# Altium footprint library Library.PcbLib: 144 footprints (part 1 of 9)
Each footprint in its own frame and in the unit in brackets; x right, y up, seen from the top. Pads: shape width x height; smd on the part's side, far side on the other; paste and mask are expansions set on the pad; w line width, h text height; cw(c..) or ccw(c..) is an arc to the next point about the centre after c.
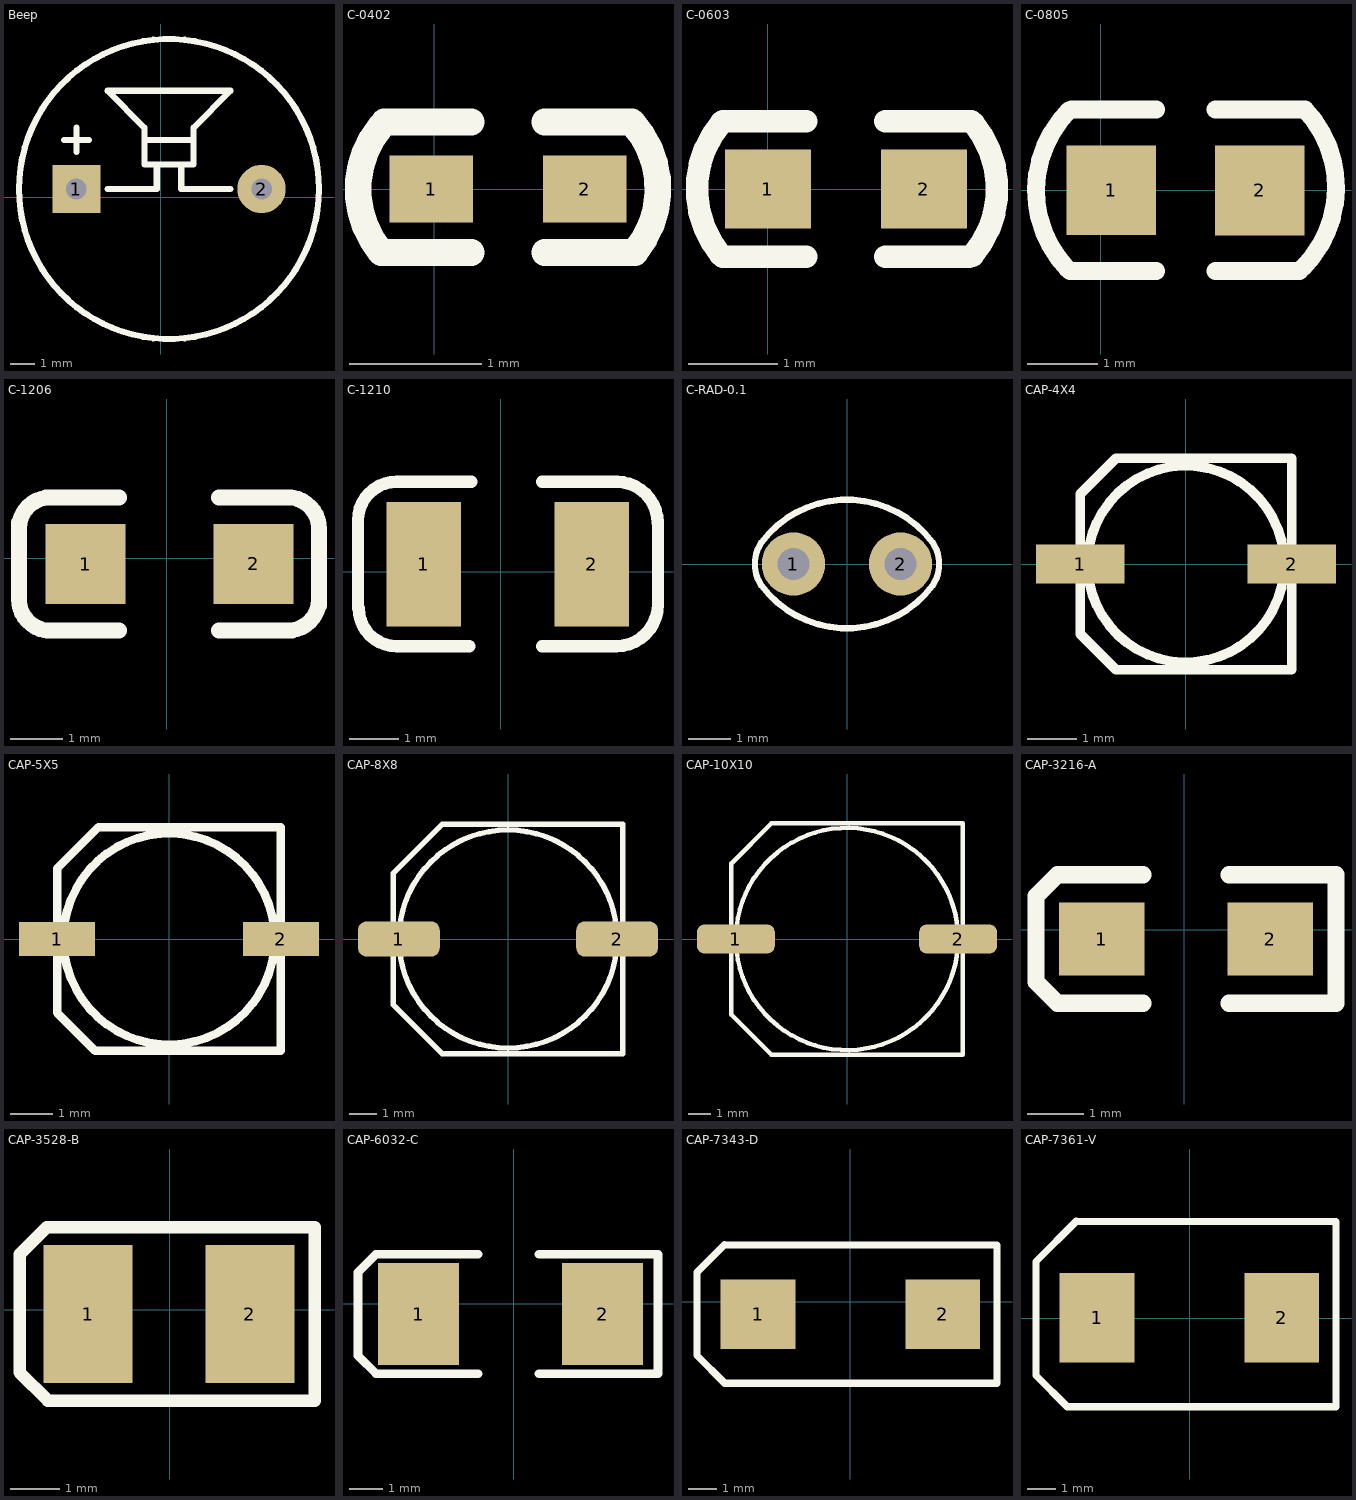
[diagram p0: the footprints below, top view; thin cyan lines are the x and y axes]

## Beep [mm] "蜂鸣器"
height 6
pads (2):
  rect 2x2 hole 0.85: 1(-3.479,0.332)
  round 2 hole 0.85: 2(4.171,0.332)
Top Overlay:
  circle w0.254: c0.346,0.332 r6.2
  lines w0.254: -3.987,2.364 -2.971,2.364 ; -3.479,1.856 -3.479,2.872 ; -2.194,0.332 -0.162,0.332 -0.162,1.348 ; -0.67,2.364 1.362,2.364 ; 0.854,1.348 0.854,0.332 2.886,0.332 ; -2.194,4.396 -0.67,2.872 -0.67,1.348 1.362,1.348 1.362,2.872 2.886,4.396 -2.194,4.396
3D body "SW3dPS-WST-1203UX.STEP": height 9.65, standoff -4.5, extent -9.108,-5.668 6.346,6.332

## C-0402 [mil]
pads (2):
  rect 25x20 smd: 1(-1,0) 2(45,0)
Top Overlay:
  lines w8: -15.94,-19 11,-19 ; -15.94,-18.95 cw(c6.42,-0.05) -15.95,18.84 ; -15,20 11,20 ; 33,-19 59.95,-19 ; 33,20 59,20 cw(c37.58,0.05) 59.95,-18.84
3D body "cap_0402.STEP": height 19.68, standoff 0, extent 2.31,-10 41.69,9.69

## C-0603 [mil]
pads (2):
  rect 38x35 smd: 1(0,0) 2(69,0)
Top Overlay:
  lines w10: -21,-29 cw(c14.45,-0.04) -20.48,29.56 ; -20,-30 17,-30 ; -20,30 17,30 ; 52,-30 89,-30 ; 52,30 90,30 ; 90.48,-29.56 ccw(c55.55,0.04) 91,29
3D body "User Library-0603 SMD Capacitor.STEP": height 11.89, standoff 0, extent 3.8,-15.8 66.8,15.7

## C-0805 [mil]
pads (2):
  rect 50x50 smd: 1(6,0) 2(88.7,-0.1)
Top Overlay:
  lines w10: -18.66,-43.67 cw(c27.24,-0.08) -17.7,44.5 ; -17.2,-45 31,-45 ; -16.3,45 31,45 ; 64,-45 111,-45 ; 64,45 113.1,45 ; 112.92,-43.04 ccw(c67.98,1.54) 114,45
3D body "User Library-0805 SMD Capacitor.STEP": height 30.39, standoff -0.39, extent 7.93,-24.5 86.67,24.71

## C-1206 [mil]
pads (2):
  rect 60x60 smd: 1(-60.91,-4.35) 2(65.09,-4.35)
Top Overlay:
  lines w11.81: -110.91,-30.35 ccw(c-87.41,-30.85) -87.91,-54.35 ; -110.91,22.65 cw(c-87.41,22.15) -86.91,45.65 ; 90.09,-54.35 ccw(c90.59,-30.85) 114.09,-31.35 ; 91.09,45.65 cw(c90.59,22.15) 114.09,21.65
  lines w12: -110.91,-31.35 -110.91,26.65 ; -89.91,-54.35 -35.91,-54.35 ; -88.91,45.65 -35.91,45.65 ; 39.09,-54.35 92.09,-54.35 ; 39.09,45.65 93.09,45.65 ; 114.09,-35.35 114.09,22.65
3D body "Capacitor 1206 SMD1.step": height 39.45, standoff 0, extent -60.89,-35.85 65.09,27.15

## C-1210 [mil]
pads (2):
  rect 60x100 smd: 1(-62,6) 2(73,6)
Top Overlay:
  lines w10: -114.8,-29.36 -114.8,41.08 cw(c-83.75,41.08) -83.75,72.13 ; -114.27,-29.36 ccw(c-83.63,-29.36) -83.63,-60 -25.3,-60 ; -83.75,72 -24,72 ; 33,-60 92.52,-60 ccw(c92.52,-26.32) 126.2,-26.32 126.2,39.82 ; 33,72 93.32,72 ; 93,72 cw(c93,39.12) 125.88,39.12
3D body "1210(3225M) Cap.STEP": height 67.1, standoff 0, extent -72.75,-44 84.75,54

## C-RAD-0.1 [mm]
pads (2):
  round 1.5 hole 0.762: 1(-1.27,0) 2(1.27,0)
Top Overlay:
  lines w0.15: -2.032,-0.508 ccw(c0,1.016) 2.032,-0.508 ; -2.032,0.508 cw(c0,-1.016) 2.032,0.508 ; -2.031,-0.507 cw(c-1.27,0) -2.031,0.507 ; 2.031,-0.507 ccw(c1.27,0) 2.031,0.507
3D body "Cap_100n.step": height 5.92, standoff -2, extent -2.919,-0.848 2.919,0.848

## CAP-4X4 [mm]
height 5.5
pads (2):
  rect 1.8x0.8 smd: 1(-2.15,0) 2(2.15,0)
Top Overlay:
  circle w0.2: c0,0 r2
  lines w0.2: -1.433,-2.139 -2.15,-1.422 ; -1.433,2.139 -2.15,1.422 ; -2.15,-1.422 -1.422,-2.15 2.15,-2.15 2.15,2.15 -1.422,2.15 -2.15,1.422 ; -2.15,-1.422 -2.15,1.422
3D body "SL-B.step": height 5.2, standoff 0, extent -2.286,-2.159 2.314,2.141

## CAP-5X5 [mm]
height 5.5
pads (2):
  rect 1.8x0.8 smd: 1(-2.65,0) 2(2.65,0)
Top Overlay:
  circle w0.2: c0,0 r2.5
  lines w0.2: -2.65,-1.744 -1.744,-2.65 2.65,-2.65 2.65,2.65 -1.668,2.65 -2.65,1.668 -2.65,-1.744
3D body "SL-D.step": height 5.2, standoff 0, extent -2.8,-2.667 2.8,2.633

## CAP-8X8 [mm]
height 10
pads (2):
  rrect50% 3x1.3 smd: 1(-4,0) 2(4,0)
Top Overlay:
  circle w0.2: c0,0 r4
  lines w0.2: -4.2,-2.413 -4.2,2.413 -2.413,4.2 4.2,4.2 4.2,-4.2 -2.413,-4.2 -4.2,-2.413
3D body "SL-H.step": height 10.5, standoff 0, extent -4.521,-4.216 4.479,4.084

## CAP-10X10 [mm]
height 10
pads (2):
  rrect50% 3.5x1.3 smd: 1(-5,0) 2(5,0)
Top Overlay:
  circle w0.2: c0,0 r5
  lines w0.2: -5.2,3.404 -5.2,-3.404 -3.404,-5.2 5.2,-5.2 5.2,5.2 -3.404,5.2 -5.191,3.413
3D body "SW3dPS-capacitor size G.STEP": height 10.21, standoff -0.01, extent -5.775,-5.118 5.825,5.182

## CAP-3216-A [mm] "钽电容"
height 2
pads (2):
  rect 1.524x1.3 smd: 1(-1.464,-0.162) 2(1.533,-0.162)
Top Overlay:
  lines w0.305: -0.727,-1.305 -2.251,-1.305 -2.632,-0.924 -2.632,0.6 -2.251,0.981 -0.727,0.981 ; 0.797,-1.305 2.702,-1.305 2.702,0.981 0.797,0.981
3D body "TAJ-A.STEP": height 1.6, standoff 0, extent -1.565,-0.95 1.635,0.65

## CAP-3528-B [mm] "钽电容"
height 3
pads (2):
  rect 1.8x2.794 smd: 1(-1.653,-0.088) 2(1.623,-0.088)
Top Overlay:
  lines w0.254: -3.038,-1.269 -2.466,-1.84 2.931,-1.84 2.931,1.665 -2.492,1.665 -3.038,1.119 -3.038,-1.269
3D body "TAJ-B.STEP": height 1.9, standoff 0, extent -1.765,-1.488 1.735,1.312

## CAP-6032-C [mil] "钽电容"
pads (2):
  rect 95x120 smd: 1(-111.97,-12.03) 2(104.03,-12.03)
Top Overlay:
  lines w10: -41.97,-82.03 -155.97,-82.03 -161.97,-82.03 -182.97,-61.03 -182.97,36.97 -162.97,56.97 -161.97,57.97 -41.97,57.97 ; 29.03,-82.03 169.03,-82.03 169.03,57.97 29.03,57.97
3D body "TAJ-C.STEP": height 102.36, standoff 0, extent -121.08,-75.02 115.14,50.96

## CAP-7343-D [mm] "钽电容"
height 4
pads (2):
  rect 2.6x2.4 smd: 1(-3.196,-0.437) 2(3.204,-0.437)
Top Overlay:
  lines w0.254: -4.363,-2.831 5.086,-2.831 ; -4.356,-2.832 -5.319,-1.869 -5.319,1.013 -4.363,1.969 5.086,1.962 ; 5.086,-2.832 5.086,1.944
3D body "TAJ-D.STEP": height 2.9, standoff 0, extent -3.644,-2.568 3.656,1.732
3D body: height 0.3, standoff 0, extent 3.314,-1.299 3.518,0.471
3D body: height 0.3, standoff 0, extent -3.481,-1.313 -3.386,0.376

## CAP-7361-V [mm] "钽电容"
pads (2):
  rect 2.6x3.1 smd: 1(-3.202,0.007) 2(3.198,0.007)
Top Overlay:
  lines w0.254: -5.325,-1.99 -4.242,-3.073 5.08,-3.073 5.08,3.352 -3.931,3.359 -5.325,1.965 -5.325,-1.99
3D body "capcp7361x38.step": height 3.45, standoff 0, extent -3.75,-3.048 3.75,3.252